# Altium footprint library PCA_0005_FULL_CB_REV_B.PcbLib: 36 footprints (part 2 of 3)
Each footprint in its own frame and in the unit in brackets; x right, y up, seen from the top. Pads: shape width x height; smd on the part's side, far side on the other; paste and mask are expansions set on the pad; w line width, h text height; cw(c..) or ccw(c..) is an arc to the next point about the centre after c.
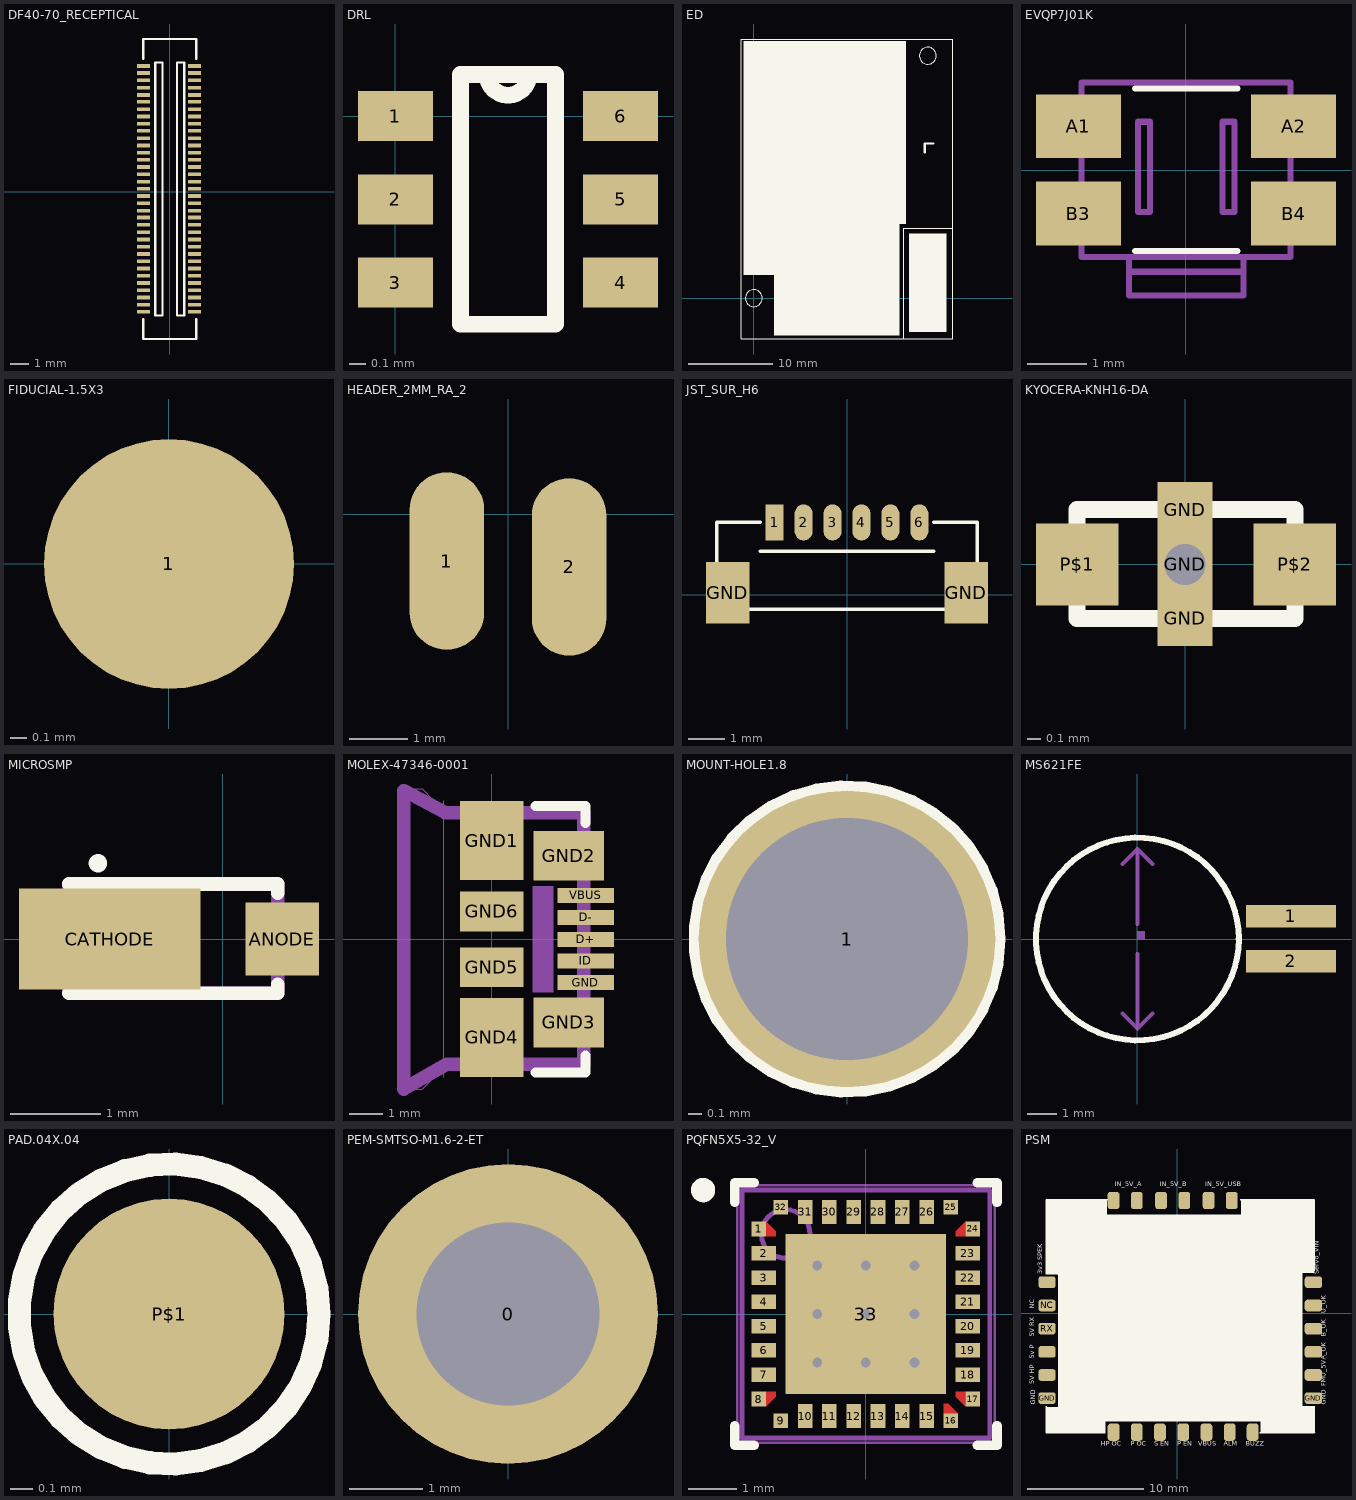
[diagram p1: the footprints below, top view; thin cyan lines are the x and y axes]

## DF40-70_RECEPTICAL [mil]
pads (70):
  rect 28x8 smd: 1(-57.09,273.5) 2(54,273.5) 3(-57.09,258.5) 4(54,258.5) 5(-57.09,242.5) 6(54,242.5) 7(-57.09,226.5) 8(54,226.5) 9(-57.09,210.5) 10(54,210.5) 11(-57.09,195.5) 12(54,195.5) 13(-57.09,179.5) 14(54,179.5) 15(-57.09,163.5) 16(54,163.5) 17(-57.09,147.5) 18(54,147.5) 19(-57.09,132.5) 20(54,132.5) 21(-57.09,116.5) 22(54,116.5) 23(-57.09,100.5) 24(54,100.5) 25(-57.09,84.5) 26(54,84.5) 27(-57.09,69.5) 28(54,69.5) 29(-57.09,53.5) 30(54,53.5) 31(-57.09,37.5) 32(54,37.5) 33(-57.09,21.5) 34(54,21.5) 35(-57.09,6.5) 36(54,6.5) 37(-57.09,-9.5) 38(54,-9.5) 39(-57.09,-25.5) 40(54,-25.5) 41(-57.09,-41.5) 42(54,-41.5) 43(-57.09,-56.5) 44(54,-56.5) 45(-57.09,-72.5) 46(54,-72.5) 47(-57.09,-88.5) 48(54,-88.5) 49(-57.09,-104.5) 50(54,-104.5) 51(-57.09,-120.37) 52(54,-120.37) 53(-57.09,-136.12) 54(54,-136.12) 55(-57.09,-151.87) 56(54,-151.87) 57(-57.09,-167.62) 58(54,-167.62) 59(-57.09,-183.37) 60(54,-183.37) 61(-57.09,-199.11) 62(54,-199.11) 63(-57.09,-214.86) 64(54,-214.86) 65(-57.09,-230.61) 66(54,-230.61) 67(-57.09,-246.36) 68(54,-246.36) 69(-57.09,-262.11) 70(54,-262.11)
Top Overlay:
  lines w5: -57.87,-277.85 -57.87,-321.16 58,-321.16 58,-277.85 ; -57.87,289.5 -57.87,332.5 58,332.5 58,289.5 ; -31.5,-269.98 -15.75,-269.98 -15.75,281.5 -31.5,281.5 -31.5,-270 ; 16,-269.98 32,-269.98 32,281.5 16,281.5 16,-270
3D body "DF40C(2.0)-70DS.stp": height 75.12, standoff -1.65, extent -67.5,-321.77 65.57,331.77

## DRL [mm]
pads (6):
  rect 0.45x0.3 smd: 1(0,0) 2(0,-0.5) 3(0,-1) 4(1.35,-1) 5(1.35,-0.5) 6(1.35,0)
Top Overlay:
  lines w0.1: 0.39,-1.25 0.39,0.25 0.8,0.25 cw(c0.675,0.25) 0.55,0.25 0.96,0.25 0.96,-1.25 0.39,-1.25
3D body: height 0.6, standoff -0.05, extent 0.4,-1.2 1,0.2

## ED [mil]
Top Overlay:
  circle w3.94: c0,0 r39.37
  circle w3.94: c811.02,1129.53 r39.37
  region: 724.41,299.21 897.64,299.21 897.64,-157.48 724.41,-157.48
  region: -47.24,1196.85 -47.24,110.24 94.49,110.24 94.49,-173.23 677.17,-173.23 677.17,346.46 708.66,346.46 708.66,1196.85
  lines w3.94: 698.82,-190.16 698.82,325.98 922.36,325.98 ; -57.87,-190.16 -57.87,1207.48 926.38,1207.48 926.38,-190.16 -57.87,-190.16
  lines w10: 796.46,678.54 796.46,720.47 835.83,720.47

## EVQP7J01K [mil]
pads (4):
  rect 56x42 smd: A1(-70.87,29) A2(71,29) B3(-70.87,-28.54) B4(71,-28.54)
Top Overlay:
  lines w4: -82.68,20 -82.68,24 ; -33.46,-53.15 34,-53.15 ; -33.46,54 34,54
Mechanical 16:
  lines w4: -82.68,20 -70.87,20 ; -82.68,24 -90.55,24 -90.55,40 -70.87,40 ; -70.87,-39.37 -90.55,-39.37 -90.55,-23.62 -82.68,-23.62 -82.68,-19.68 -70.87,-19.68 ; 38,-66.93 -37.4,-66.93 ; 71,-39.37 91,-39.37 91,-23.62 83,-23.62 83,-19.68 71,-19.68 ; 71,20 83,20 83,24 91,24 91,40 71,40 ; -37.4,-66.93 -37.4,-57.09 ; -37.4,-66.93 -37.4,-82.68 38,-82.68 38,-57.09 ; -37.4,-57.09 38,-57.09 ; -37.4,-57.09 -68.9,-57.09 -68.9,58 69,58 69,-57.09 38,-57.09 ; -31.5,-27.56 -23.62,-27.56 -23.62,32 -31.5,32 -31.5,-27.56 ; 24,-27.56 32,-27.56 32,32 24,32 24,-27.56
3D body "EVQP7-JA-01P.STEP": height -62.99, standoff -116.14, extent -92.52,-82.68 92.52,57.09

## FIDUCIAL-1.5X3 [mil]
pads (1):
  rrect100% 60x60 smd paste-78.74: 1(0,0)
Top Solder:
  circle w50: c0,0 r36

## HEADER_2MM_RA_2 [mil]
pads (2):
  rrect100% 50x119 smd: 1(-41.19,-31.46) 2(40.8,-35.39)

## JST_SUR_H6 [mm]
pads (8):
  rect 0.5x1 smd: 1(-2,2)
  rrect100% 0.5x1 smd: 2(-1.2,2) 3(-0.4,2) 4(0.4,2) 5(1.2,2) 6(2,2)
  rect 1.2x1.7 smd: GND(-3.3,0.05) GND(3.3,0.05)
Top Overlay:
  lines w0.1: -2.4,1.2 2.4,1.2 ; -2.4,2 -3.6,2 -3.6,-0.4 3.6,-0.4 3.6,2 2.4,2
  text "." at -2.4,2.8 h0.7
3D body "SM06B-SURS-TF.STEP": height 1.7, standoff -0.05, extent -3.5,-0.4 3.5,2.3

## KYOCERA-KNH16-DA [mil] "KYOCERA-KNH16-DA"
pads (5):
  rect 16x16 smd: GND(0,-15.75) GND(0,16)
  rect 16x16 hole 12: GND(0,0)
  rect 24x24 smd: P$1(-31.5,0) P$2(32,0)
Top Overlay:
  lines w5: -31.5,-15.75 -31.5,16 32,16 32,-15.75 -31.5,-15.75
3D body "KYOCERA-KNH16-DA.STEP": height 13.78, standoff 0, extent -19.68,-9.84 19.68,9.84

## MICROSMP [mil]
pads (2):
  rect 32x32 smd: ANODE(26,0)
  rect 79x44 smd: CATHODE(-49.21,0)
Top Overlay:
  circle w4: c-54.33,33 r2
  lines w6: -66.93,-23.62 24,-23.62 24,-19.68 ; -66.93,24 24,24 24,20
Mechanical 16:
  rectangle: -59.05,-21.65 -49.21,22
  rectangle: 26,-11.81 30,12
  rectangle: -74.8,-17.72 -68.89,18
  lines w1: -66.93,-23.62 -66.93,24 24,24 24,-23.62 -66.93,-23.62
  lines w6: -66.93,-23.62 -66.93,24 24,24 24,-23.62 -66.93,-23.62

## MOLEX-47346-0001 [mil]
pads (11):
  rect 67x18 smd: D+(111,0) D-(111,26) GND(111,-51.18) ID(111,-25.59) VBUS(111,52)
  rect 75x94 smd: GND1(0,117) GND4(0,-116.14)
  rect 83x59 smd: GND2(91,99) GND3(91,-98.43)
  rect 75x47 smd: GND5(0,-32.97) GND6(0,33)
Top Overlay:
  lines w12: 52,-157.48 111,-157.48 111,-137.8 ; 52,158 111,158 111,138
Mechanical 8:
  rectangle: 48,-62.99 73,63
Mechanical 16:
  lines w0: -57.09,-163.39 -57.09,164
  lines w1: -106.3,-177.17 -106.3,178 -82.68,178 -55.12,150 107,150 111,146 111,-145.67 107,-149.61 -55.12,-149.61 -82.68,-177.17 -106.3,-177.17
  lines w16: -104.33,-177.17 -104.33,176 -55.12,150 109,150 109,-147.64 -53.15,-147.64 -104.33,-177.17
3D body "473460001.stp": height 107.09, standoff -8.66, extent -93.7,-157.09 120.08,157.09

## MOUNT-HOLE1.8 [mil]
pads (1):
  round 87 hole 71: 1(0,0)
Top Overlay:
  circle w5: c0,0 r44
Bottom Overlay:
  circle w5: c0,0 r44
  circle w5: c0,0 r44

## MS621FE [mil]
pads (2):
  rect 119x30 smd: 1(203,30) 2(203,-29.53)
Top Overlay:
  circle w8: c0,0 r134
Mechanical 16:
  region: 0,0 10,0 10,10 0,10
  region: 0,0 10,0 10,10 0,10
  lines w5: -19.68,-98.43 0,-118.11 ; -19.68,99 0,119 ; 0,-19.68 0,-118.11 ; 0,20 0,119 ; 20,-98.43 0,-118.11 ; 20,99 0,119
  text "6.8MM" at -47.24,-11.81 h27.56

## PAD.04X.04 [mil]
pads (1):
  rrect100% 40x40 smd paste-78.74: P$1(0,0)
Top Overlay:
  circle w4: c0,0 r26

## PEM-SMTSO-M1.6-2-ET [mm] "Surface mount thread"
height 2
pads (1):
  round 4.1 hole 2.5 paste-2 mask-2: 0(0,0)
Top Paste:
  lines w1: -1.414,-0.707 ccw(c0,0) -0.707,-1.414 ; -1.414,0.707 cw(c0,0) -0.707,1.414 ; 0.707,-1.414 ccw(c0,0) 1.414,-0.707 ; 0.707,1.414 cw(c0,0) 1.414,0.707
Top Solder:
  lines w1: -1.414,-0.707 ccw(c0,0) -0.707,-1.414 ; -1.414,0.707 cw(c0,0) -0.707,1.414 ; 0.707,-1.414 ccw(c0,0) 1.414,-0.707 ; 0.707,1.414 cw(c0,0) 1.414,0.707
3D body "SMTSO-M1.6-2ET.STEP": height 2, standoff -0.48, extent -1.59,-1.83 1.59,1.83

## PQFN5X5-32_V [mm] "QFN, 32-Leads, Body 5x5mm, Pitch 0.5mm, Thermal Pad 3.3x3.3mm, FTDI Recommended"
height 1
pads (33):
  rect 0.3x0.3 smd paste-0.15 mask-0.15: 1(-2.2,1.75) 8(-2.2,-1.75) 9(-1.75,-2.2) 16(1.75,-2.2) 17(2.2,-1.75) 24(2.2,1.75) 25(1.75,2.2) 32(-1.75,2.2)
  rect 0.5x0.3 smd paste-0.15 mask+0.06: 2(-2.1,1.25) 3(-2.1,0.75) 4(-2.1,0.25) 5(-2.1,-0.25) 6(-2.1,-0.75) 7(-2.1,-1.25) 18(2.1,-1.25) 19(2.1,-0.75) 20(2.1,-0.25) 21(2.1,0.25) 22(2.1,0.75) 23(2.1,1.25)
  rect 0.3x0.5 smd paste-0.15 mask+0.06: 10(-1.25,-2.1) 11(-0.75,-2.1) 12(-0.25,-2.1) 13(0.25,-2.1) 14(0.75,-2.1) 15(1.25,-2.1) 26(1.25,2.1) 27(0.75,2.1) 28(0.25,2.1) 29(-0.25,2.1) 30(-0.75,2.1) 31(-1.25,2.1)
  rect 3.3x3.3 smd paste-1.65 mask+0.06: 33(0,0)
via -1,1 diameter 0.5 hole 0.2
via 0,1 diameter 0.5 hole 0.2
via 1,1 diameter 0.5 hole 0.2
via -1,0 diameter 0.5 hole 0.2
via 0,0 diameter 0.5 hole 0.2
via 1,0 diameter 0.5 hole 0.2
via -1,-1 diameter 0.5 hole 0.2
via 0,-1 diameter 0.5 hole 0.2
via 1,-1 diameter 0.5 hole 0.2
Top Layer:
  region: 1.6,-1.85 1.6,-2.05 1.9,-2.05 1.7,-1.85
  region: -2.05,1.6 -1.85,1.6 -1.85,1.7 -2.05,1.9
  region: 2.05,1.6 1.85,1.6 1.85,1.7 2.05,1.9
  region: 2.05,-1.6 1.85,-1.6 1.85,-1.7 2.05,-1.9
  region: -2.05,-1.6 -1.85,-1.6 -1.85,-1.7 -2.05,-1.9
Top Overlay:
  circle w0.25: c-3.35,2.55 r0.125
  lines w0.2: -2.7,-2.3 -2.7,-2.7 -2.3,-2.7 ; -2.7,2.3 -2.7,2.7 -2.3,2.7 ; 2.3,-2.7 2.7,-2.7 2.7,-2.3 ; 2.3,2.7 2.7,2.7 2.7,2.3
Top Paste:
  rectangle: -0.3,1.1 0.3,1.4
  rectangle: -1.3,1.1 -0.7,1.4
  rectangle: 0.7,1.1 1.3,1.4
  rectangle: -0.3,0.6 0.3,0.9
  rectangle: 0.7,0.6 1.3,0.9
  rectangle: -1.3,0.6 -0.7,0.9
  rectangle: -0.3,-0.9 0.3,-0.6
  rectangle: -1.3,-0.9 -0.7,-0.6
  rectangle: 0.7,-0.9 1.3,-0.6
  rectangle: -0.3,-1.4 0.3,-1.1
  rectangle: 0.7,-1.4 1.3,-1.1
  rectangle: -1.3,-1.4 -0.7,-1.1
  rectangle: -1.3,-0.4 -0.7,-0.1
  rectangle: 0.7,-0.4 1.3,-0.1
  rectangle: -0.3,-0.4 0.3,-0.1
  rectangle: 0.7,0.1 1.3,0.4
  rectangle: -1.3,0.1 -0.7,0.4
  rectangle: -0.3,0.1 0.3,0.4
  region: -1.1,1.85 -1.1,2.45 -1.4,2.45 -1.4,1.85
  region: -0.6,1.85 -0.6,2.45 -0.9,2.45 -0.9,1.85
  region: -0.1,1.85 -0.1,2.45 -0.4,2.45 -0.4,1.85
  region: 0.4,1.85 0.4,2.45 0.1,2.45 0.1,1.85
  region: 0.9,1.85 0.9,2.45 0.6,2.45 0.6,1.85
  region: 1.4,1.85 1.4,2.45 1.1,2.45 1.1,1.85
  region: -1.4,-1.85 -1.4,-2.45 -1.1,-2.45 -1.1,-1.85
  region: -0.9,-1.85 -0.9,-2.45 -0.6,-2.45 -0.6,-1.85
  region: -0.4,-1.85 -0.4,-2.45 -0.1,-2.45 -0.1,-1.85
  region: 0.1,-1.85 0.1,-2.45 0.4,-2.45 0.4,-1.85
  region: 0.6,-1.85 0.6,-2.45 0.9,-2.45 0.9,-1.85
  region: 1.1,-1.85 1.1,-2.45 1.4,-2.45 1.4,-1.85
  region: -1.85,1.4 -2.45,1.4 -2.45,1.1 -1.85,1.1
  region: -1.85,0.9 -2.45,0.9 -2.45,0.6 -1.85,0.6
  region: -1.85,0.4 -2.45,0.4 -2.45,0.1 -1.85,0.1
  region: -1.85,-0.1 -2.45,-0.1 -2.45,-0.4 -1.85,-0.4
  region: -1.85,-0.6 -2.45,-0.6 -2.45,-0.9 -1.85,-0.9
  region: -1.85,-1.1 -2.45,-1.1 -2.45,-1.4 -1.85,-1.4
  rectangle: 1.85,-1.4 2.45,-1.1
  rectangle: 1.85,-0.9 2.45,-0.6
  rectangle: 1.85,-0.4 2.45,-0.1
  rectangle: 1.85,0.1 2.45,0.4
  rectangle: 1.85,0.6 2.45,0.9
  rectangle: 1.85,1.1 2.45,1.4
  region: -1.6,1.85 -1.6,2.45 -1.9,2.45 -1.9,2.05 -1.7,1.85
  region: -1.6,-1.85 -1.6,-2.45 -1.9,-2.45 -1.9,-2.05 -1.7,-1.85
  region: -1.85,-1.6 -2.45,-1.6 -2.45,-1.9 -2.05,-1.9 -1.85,-1.7
  region: -1.85,1.6 -2.45,1.6 -2.45,1.9 -2.05,1.9 -1.85,1.7
  region: 1.6,1.85 1.6,2.45 1.9,2.45 1.9,2.05 1.7,1.85
  region: 1.85,-1.6 2.45,-1.6 2.45,-1.9 2.05,-1.9 1.85,-1.7
  region: 1.85,1.6 2.45,1.601 2.45,1.899 2.05,1.9 1.85,1.7
  region: 1.6,-1.85 1.6,-2.45 1.9,-2.45 1.9,-2.05 1.7,-1.85
Top Solder:
  region: -1.96,2.025 -1.96,2.41 -1.54,2.41 -1.54,1.79 -1.725,1.79
  region: -1.96,-2.025 -1.96,-2.41 -1.54,-2.41 -1.54,-1.79 -1.725,-1.79
  region: -2.025,-1.96 -2.41,-1.96 -2.41,-1.54 -1.79,-1.54 -1.79,-1.725
  region: -2.025,1.96 -2.41,1.96 -2.41,1.54 -1.79,1.54 -1.79,1.725
  region: 1.96,2.025 1.96,2.41 1.54,2.41 1.54,1.79 1.725,1.79
  region: 2.025,-1.96 2.41,-1.96 2.41,-1.54 1.79,-1.54 1.79,-1.725
  region: 2.025,1.96 2.41,1.96 2.41,1.54 1.79,1.54 1.79,1.725
  region: 1.96,-2.025 1.96,-2.41 1.54,-2.41 1.54,-1.79 1.725,-1.79
Mechanical 13:
  circle w0.1: c-1.65,1.65 r0.5
  lines w0.1: -2.55,-2.55 -2.55,2.55 2.55,2.55 2.55,-2.55 -2.55,-2.55
Mechanical 15:
  lines w0.05: -2.65,-2.65 -2.65,2.65 2.65,2.65 2.65,-2.65 -2.65,-2.65
  lines w0.1: -0.5,0 0.5,0 ; 0,-0.5 0,0.5
3D body: height 1, standoff 0, extent -2.55,-2.55 2.55,2.55

## PSM [mm]
pads (25):
  rrect50% 1.5x1.016 smd: 5V_HIPOWER(-11.25,-5.318) 5V_PERIPH(-11.25,-3.317) !VBUS_VALID(11.75,0.686) !VDD_BACKUP_VALID(11.75,-1.318) !VDD_BRICK_VALID(11.75,-3.317) GND(-11.25,-7.318) GND(11.75,-7.318) NC(-11.25,0.686) RX(-11.25,-1.318) SERVO_IN(11.75,2.692) SPEK(-11.25,2.692) VDD_5V_IN_PROT(11.75,-5.318)
  rrect50% 1.016x1.5 smd: !VDD_5V_HIPOWER_OC(-5.5,-10.25) !VDD_5V_PERIPH_EN(0.508,-10.25) !VDD_5V_PERIPH_OC(-3.5,-10.25) ALARM(4.521,-10.25) BUZZER_OUT(6.502,-10.25) VBUS(2.515,-10.25) VDD_3V3_SPEKTRUM_EN(-1.5,-10.25) VDD_5V_BACKUP(-1.4,9.75) VDD_5V_BACKUP(0.6,9.75) VDD_BRICK_IN(-5.5,9.75) VDD_BRICK_IN(-3.5,9.75) VDD_VBUS(2.7,9.75) VDD_VBUS(4.7,9.75)
Top Overlay:
  region: -11.3,9.8 -6.1,9.8 -6.1,8.5 5.5,8.5 5.5,9.8 11.8,9.8 11.8,3.5 10.8,3.5 10.8,-8 11.8,-8 11.8,-10.1 11.9,-10.3 7.2,-10.3 7.2,-9.3 -6.2,-9.3 -6.2,-10.2 -6.236,-10.236 -11.303,-10.236 -11.303,-8.103 -11.3,-8.1 -10.3,-8.1 -10.3,3.3 -10.4,3.4 -11.3,3.4
  lines w0.127: -11.325,-8 -11.318,-10.318 -6.23,-10.318 ; -11.325,3.378 -11.325,9.83 -5.953,9.83 ; 5.436,9.83 11.836,9.83 11.836,3.683 ; 7.137,-10.318 11.836,-10.318 11.836,-8
  text "3DR Part# PCA_0007" at -1.82,-4.61 h0.7
  text "IN_5V_A" at -5.4,10.8 h0.7
  text "IN_5V_B" at -1.5,10.8 h0.7
  text "IN_5V_USB" at 2.4,10.8 h0.7
  text "3v3 SPEK" at -11.5,3.4 h0.7
  text "5V RX" at -12.2,-2 h0.7
  text "NC" at -12.193,0.4 h0.7
  text "5v P" at -12.2,-3.9 h0.7
  text "5V HP" at -12.2,-6.1 h0.7
  text "GND" at 13,-7.9 h0.7
  text "Servo_VIN" at 12.4,3.4 h0.7
  text "U_OK" at 13,0 h0.7
  text "B_OK" at 13,-2 h0.7
  text "A_OK" at 13,-4 h0.7
  text "FMU_5V" at 13,-6.3 h0.7
  text "GND" at -12.1,-7.9 h0.7
  text "BUZZ" at 5.9,-11.6 h0.7
  text "HP OC" at -6.6,-11.6 h0.7
  text "P OC" at -4,-11.6 h0.7
  text "S EN" at -2,-11.6 h0.7
  text "P EN" at 0,-11.6 h0.7
  text "VBUS" at 1.8,-11.6 h0.7
  text "ALM" at 4,-11.6 h0.7
  text "POWER IN" at -0.89,6.35 h0.7
  text "IO and power PixHawk2" at -2.62,-3.81 h0.7
Mechanical 16:
  region: 0,0 0.254,0 0.254,0.254 0,0.254
3D body "power.step": height 2.11, standoff 0, extent -11.303,-10.236 11.659,9.728